# Altium footprint library ICs And Semiconductors SMD.PcbLib: 943 footprints (part 3 of 60)
Each footprint in its own frame and in the unit in brackets; x right, y up, seen from the top. Pads: shape width x height; smd on the part's side, far side on the other; paste and mask are expansions set on the pad; w line width, h text height; cw(c..) or ccw(c..) is an arc to the next point about the centre after c.
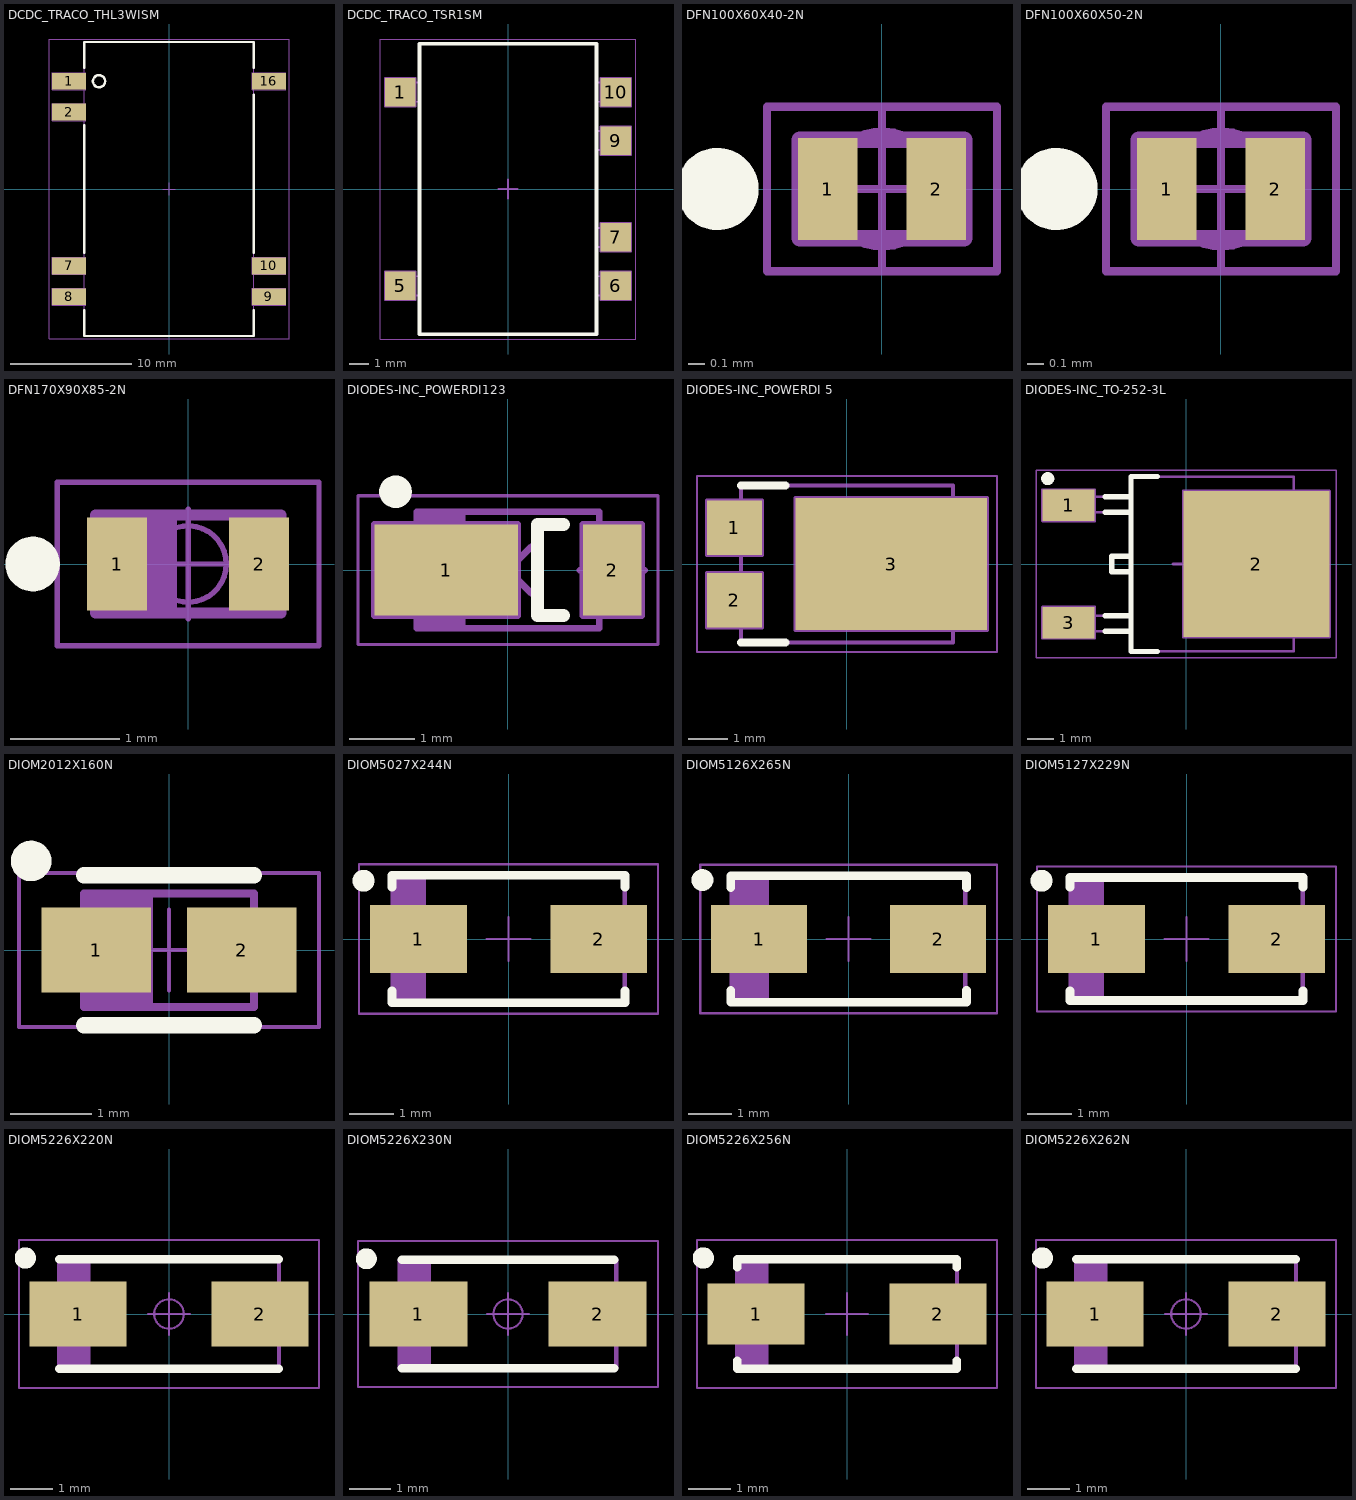
[diagram p2: the footprints below, top view; thin cyan lines are the x and y axes]

## DCDC_TRACO_THL3WISM [mm] "THL 3 WISM Series, DC/DC Converter,  Body 24x13.7mm"
height 8.5
pads (7):
  rect 2.8x1.4 smd: 1(-8.25,8.89) 2(-8.25,6.35) 7(-8.25,-6.35) 8(-8.25,-8.89) 9(8.25,-8.89) 10(8.25,-6.35) 16(8.25,8.89)
Top Overlay:
  circle w0.2: c-5.775,8.89 r0.5
  lines w0.2: -6.975,-9.99 -6.975,-12.125 6.975,-12.125 6.975,-9.99 ; -6.975,-5.25 -6.975,5.25 ; -6.975,9.99 -6.975,12.125 6.975,12.125 6.975,9.99 ; 6.975,-5.25 6.975,7.79
Mechanical 8:
  lines w0.1: -8.75,-8.89 -8.25,-8.89 ; -8.75,-6.35 -8.25,-6.35 ; -8.75,6.35 -8.25,6.35 ; -8.75,8.89 -8.25,8.89 ; -8.25,-9.39 -8.25,-8.89 ; -8.25,-8.39 -8.25,-8.89 ; -8.25,-6.85 -8.25,-6.35 ; -8.25,-5.85 -8.25,-6.35 ; -8.25,5.85 -8.25,6.35 ; -8.25,6.85 -8.25,6.35 ; -8.25,8.39 -8.25,8.89 ; -8.25,9.39 -8.25,8.89 ; -7.75,-8.89 -8.25,-8.89 ; -7.75,-6.35 -8.25,-6.35 ; -7.75,6.35 -8.25,6.35 ; -7.75,8.89 -8.25,8.89 ; -0.5,0 0,0 ; 0,-0.5 0,0 ; 0,0.5 0,0 ; 0.5,0 0,0 ; 7.75,-8.89 8.25,-8.89 ; 7.75,-6.35 8.25,-6.35 ; 7.75,8.89 8.25,8.89 ; 8.25,-9.39 8.25,-8.89 ; 8.25,-8.39 8.25,-8.89 ; 8.25,-6.85 8.25,-6.35 ; 8.25,-5.85 8.25,-6.35 ; 8.25,8.39 8.25,8.89 ; 8.25,9.39 8.25,8.89 ; 8.75,-8.89 8.25,-8.89 ; 8.75,-6.35 8.25,-6.35 ; 8.75,8.89 8.25,8.89 ; -9.65,-9.59 -6.85,-9.59 -6.85,-8.19 -9.65,-8.19 -9.65,-9.59 ; -9.65,-7.05 -6.85,-7.05 -6.85,-5.65 -9.65,-5.65 -9.65,-7.05 ; -9.65,5.65 -6.85,5.65 -6.85,7.05 -9.65,7.05 -9.65,5.65 ; -9.65,8.19 -6.85,8.19 -6.85,9.59 -9.65,9.59 -9.65,8.19 ; 6.85,-9.59 9.65,-9.59 9.65,-8.19 6.85,-8.19 6.85,-9.59 ; 6.85,-7.05 9.65,-7.05 9.65,-5.65 6.85,-5.65 6.85,-7.05 ; 6.85,8.19 9.65,8.19 9.65,9.59 6.85,9.59 6.85,8.19
Mechanical 14:
  circle w0.1: c-5.775,8.89 r0.5
  lines w0.1: -6.975,-9.39 -9.05,-9.39 -9.05,-8.39 -6.975,-8.39 ; -6.975,-6.85 -9.05,-6.85 -9.05,-5.85 -6.975,-5.85 ; -6.975,5.85 -9.05,5.85 -9.05,6.85 -6.975,6.85 ; -6.975,8.39 -9.05,8.39 -9.05,9.39 -6.975,9.39 ; 6.975,-9.39 9.05,-9.39 9.05,-8.39 6.975,-8.39 ; 6.975,-6.85 9.05,-6.85 9.05,-5.85 6.975,-5.85 ; 6.975,8.39 9.05,8.39 9.05,9.39 6.975,9.39 ; -6.975,-12.125 -6.975,12.125 6.975,12.125 6.975,-12.125 -6.975,-12.125
Mechanical 15:
  lines w0.05: -9.9,-12.375 9.9,-12.375 9.9,12.375 -9.9,12.375 -9.9,-12.375
3D body "DCDC_TRACO_THL3WISM.stp": height 8.5, standoff 0, extent -9.05,-12.125 9.05,12.125

## DCDC_TRACO_TSR1SM [mm] "TSR 1 SM Series, DC/DC Converter,  Body 15.24 x 11.8 x 7.62mm"
height 8.12
pads (6):
  rect 1.61x1.5 smd: 1(-5.655,5.08) 5(-5.655,-5.08) 6(5.655,-5.08) 7(5.655,-2.54) 9(5.655,2.54) 10(5.655,5.08)
Top Overlay:
  lines w0.2: -4.65,-7.62 -4.65,7.62 4.65,7.62 4.65,-7.62 -4.65,-7.62
Mechanical 8:
  lines w0.1: -6.155,-5.08 -5.655,-5.08 ; -6.155,5.08 -5.655,5.08 ; -5.655,-5.58 -5.655,-5.08 ; -5.655,-4.58 -5.655,-5.08 ; -5.655,4.58 -5.655,5.08 ; -5.655,5.58 -5.655,5.08 ; -5.155,-5.08 -5.655,-5.08 ; -5.155,5.08 -5.655,5.08 ; -0.5,0 0,0 ; 0,-0.5 0,0 ; 0,0.5 0,0 ; 0.5,0 0,0 ; 5.155,-5.08 5.655,-5.08 ; 5.155,-2.54 5.655,-2.54 ; 5.155,2.54 5.655,2.54 ; 5.155,5.08 5.655,5.08 ; 5.655,-5.58 5.655,-5.08 ; 5.655,-4.58 5.655,-5.08 ; 5.655,-3.04 5.655,-2.54 ; 5.655,-2.04 5.655,-2.54 ; 5.655,2.04 5.655,2.54 ; 5.655,3.04 5.655,2.54 ; 5.655,4.58 5.655,5.08 ; 5.655,5.58 5.655,5.08 ; 6.155,-5.08 5.655,-5.08 ; 6.155,-2.54 5.655,-2.54 ; 6.155,2.54 5.655,2.54 ; 6.155,5.08 5.655,5.08 ; -6.46,-5.83 -6.46,-4.33 -4.85,-4.33 -4.85,-5.83 -6.46,-5.83 ; -6.46,4.33 -6.46,5.83 -4.85,5.83 -4.85,4.33 -6.46,4.33 ; 4.85,-5.83 4.85,-4.33 6.46,-4.33 6.46,-5.83 4.85,-5.83 ; 4.85,-3.29 4.85,-1.79 6.46,-1.79 6.46,-3.29 4.85,-3.29 ; 4.85,1.79 4.85,3.29 6.46,3.29 6.46,1.79 4.85,1.79 ; 4.85,4.33 4.85,5.83 6.46,5.83 6.46,4.33 4.85,4.33
Mechanical 14:
  lines w0.1: -4.65,-5.58 -4.8,-5.58 -5.3,-5.33 -5.91,-5.33 -5.91,-4.83 -5.3,-4.83 -4.8,-4.58 -4.65,-4.58 ; -4.65,4.58 -4.8,4.58 -5.3,4.83 -5.91,4.83 -5.91,5.33 -5.3,5.33 -4.8,5.58 -4.65,5.58 ; 4.65,-5.58 4.8,-5.58 5.3,-5.33 5.91,-5.33 5.91,-4.83 5.3,-4.83 4.8,-4.58 4.65,-4.58 ; 4.65,-3.04 4.8,-3.04 5.3,-2.79 5.91,-2.79 5.91,-2.29 5.3,-2.29 4.8,-2.04 4.65,-2.04 ; 4.65,2.04 4.8,2.04 5.3,2.29 5.91,2.29 5.91,2.79 5.3,2.79 4.8,3.04 4.65,3.04 ; 4.65,4.58 4.8,4.58 5.3,4.83 5.91,4.83 5.91,5.33 5.3,5.33 4.8,5.58 4.65,5.58 ; -4.65,-7.62 -4.65,7.62 4.65,7.62 4.65,-7.62 -4.65,-7.62
Mechanical 15:
  lines w0.05: -6.71,-7.87 -6.71,7.87 6.71,7.87 6.71,-7.87 -6.71,-7.87
3D body "DCDC_TRACO_TSR1SM.stp": height 7.55, standoff 0, extent -5.91,-7.625 5.91,7.625

## DFN100X60X40-2N [mm] "DFN; 2 pin,1.00mm L X 0.60mm W X 0.40mm H, IPC Medium Density"
height 0.4
pads (2):
  rect 0.36x0.62 smd: 1(-0.33,0) 2(0.33,0)
Top Overlay:
  circle w0.25: c-1,0 r0.125
Mechanical 14:
  lines w0.1: -0.4,-0.3 -0.4,0.3 ; -0.3,-0.3 -0.3,0.3 ; -0.5,-0.3 -0.5,0.3 0.5,0.3 0.5,-0.3 -0.5,-0.3
Mechanical 15:
  circle w0.05: c0,0 r0.35
  lines w0.05: -0.5,0 0.5,0 ; 0,-0.5 0,0.5 ; -0.7,-0.5 -0.7,0.5 0.7,0.5 0.7,-0.5 -0.7,-0.5
3D body "DFN100X60X40-2N.stp": height 0.4, standoff 0, extent -0.525,-0.325 0.525,0.325

## DFN100X60X50-2N [mm] "DFN; 2 pin,1.00mm L X 0.60mm W X 0.50mm H, IPC Medium Density"
height 0.5
pads (2):
  rect 0.36x0.62 smd: 1(-0.33,0) 2(0.33,0)
Top Overlay:
  circle w0.25: c-1,0 r0.125
Mechanical 14:
  lines w0.1: -0.4,-0.3 -0.4,0.3 ; -0.3,-0.3 -0.3,0.3 ; -0.5,-0.3 -0.5,0.3 0.5,0.3 0.5,-0.3 -0.5,-0.3
Mechanical 15:
  circle w0.05: c0,0 r0.35
  lines w0.05: -0.5,0 0.5,0 ; 0,-0.5 0,0.5 ; -0.7,-0.5 -0.7,0.5 0.7,0.5 0.7,-0.5 -0.7,-0.5
3D body "DFN100X60X50-2N.stp": height 0.5, standoff 0, extent -0.525,-0.325 0.525,0.325

## DFN170X90X85-2N [mm] "DFN; 2 Pin,1.70mm L X 0.90mm W X 0.85mm H, IPC Medium Density"
height 0.85
pads (2):
  rect 0.55x0.85 smd: 1(-0.65,0) 2(0.65,0)
Top Overlay:
  circle w0.25: c-1.425,0 r0.125
Mechanical 14:
  lines w0.1: -0.75,-0.45 -0.75,0.45 ; -0.65,-0.45 -0.65,0.45 ; -0.55,-0.45 -0.55,0.45 ; -0.45,-0.45 -0.45,0.45 ; -0.35,-0.45 -0.35,0.45 ; -0.25,-0.45 -0.25,0.45 ; -0.15,-0.45 -0.15,0.45 ; -0.85,-0.45 -0.85,0.45 0.85,0.45 0.85,-0.45 -0.85,-0.45
Mechanical 15:
  circle w0.05: c0,0 r0.35
  lines w0.05: -0.5,0 0.5,0 ; 0,-0.5 0,0.5 ; -1.2,-0.75 1.2,-0.75 1.2,0.75 -1.2,0.75 -1.2,-0.75
3D body "DFN170X90X85-2N.stp": height 0.85, standoff 0, extent -0.9,-0.5 0.9,0.5

## DIODES-INC_POWERDI123 [mm] "SODFL Diode; 2.8mm W X 1.78mm L X mm H Body, POWERDI®123 Case"
height 1
pads (2):
  rect 2.2x1.4 smd: 1(-0.95,0)
  rect 0.9x1.4 smd: 2(1.6,0)
Top Overlay:
  circle w0.25: c-1.725,1.2 r0.125
  lines w0.2: 0.85,-0.7 0.45,-0.7 0.45,0.7 0.85,0.7
Mechanical 8:
  lines w0.1: -1.45,0 -0.95,0 ; -0.95,-0.5 -0.95,0 ; -0.95,0.5 -0.95,0 ; -0.45,0 -0.95,0 ; -0.354,-0.354 0,0 ; -0.354,0.354 0,0 ; 0.354,-0.354 0,0 ; 0.354,0.354 0,0 ; 1.1,0 1.6,0 ; 1.6,-0.5 1.6,0 ; 1.6,0.5 1.6,0 ; 2.1,0 1.6,0 ; -2.05,-0.7 0.15,-0.7 0.15,0.7 -2.05,0.7 -2.05,-0.7 ; 1.15,-0.7 1.15,0.7 2.05,0.7 2.05,-0.7 1.15,-0.7
Mechanical 14:
  lines w0.1: -1.3,-0.89 -1.3,0.89 ; -1.2,-0.89 -1.2,0.89 ; -1.1,-0.89 -1.1,0.89 ; -1,-0.89 -1,0.89 ; -0.9,-0.89 -0.9,0.89 ; -0.8,-0.89 -0.8,0.89 ; -0.7,-0.89 -0.7,0.89 ; 1.397,-0.887 1.4,0.89 -1.4,0.89 -1.4,-0.89 1.4,-0.89
Mechanical 15:
  lines w0.05: -2.3,-1.14 2.3,-1.14 2.3,1.14 -2.3,1.14 -2.3,-1.14
3D body "DIODES-INC_POWERDI123.stp": height 1, standoff 0, extent -1.85,-0.89 1.85,0.89

## DIODES-INC_POWERDI 5 [mm] "2.28mm pitch; 3 pin, 5.375mm L X 3.975mm W X 1.150mm H body, POWERDI 5"
height 1.15
pads (3):
  rect 1.4x1.39 smd: 1(-2.856,0.92) 2(-2.856,-0.92)
  rect 4.86x3.36 smd: 3(1.126,0)
Top Overlay:
  lines w0.2: -2.687,-1.988 -1.56,-1.988 ; -2.687,1.988 -1.56,1.988
Mechanical 8:
  lines w0.1: -3.356,-0.92 -2.856,-0.92 ; -3.356,0.92 -2.856,0.92 ; -2.856,-1.42 -2.856,-0.92 ; -2.856,-0.42 -2.856,-0.92 ; -2.856,0.42 -2.856,0.92 ; -2.856,1.42 -2.856,0.92 ; -2.356,-0.92 -2.856,-0.92 ; -2.356,0.92 -2.856,0.92 ; -0.354,-0.354 0,0 ; -0.354,0.354 0,0 ; 0.354,-0.354 0,0 ; 0.354,0.354 0,0 ; 0.626,0 1.126,0 ; 1.126,-0.5 1.126,0 ; 1.126,0.5 1.126,0 ; 1.626,0 1.126,0 ; -3.556,-1.615 -2.156,-1.615 -2.156,-0.225 -3.556,-0.225 -3.556,-1.615 ; -3.556,0.225 -2.156,0.225 -2.156,1.615 -3.556,1.615 -3.556,0.225 ; -1.304,-1.68 3.556,-1.68 3.556,1.68 -1.304,1.68 -1.304,-1.68
Mechanical 14:
  lines w0.1: -2.687,-1.365 -3.25,-1.365 -3.25,-0.475 -2.687,-0.475 ; -2.687,-0.445 -2.687,0.445 ; -2.687,0.475 -3.25,0.475 -3.25,1.365 -2.687,1.365 ; 2.688,-0.895 3.25,-0.895 3.25,-0.595 3.15,-0.595 3.15,0.595 3.25,0.595 3.25,0.895 2.688,0.895 ; -2.687,-1.988 2.688,-1.988 2.688,1.988 -2.687,1.988 -2.687,-1.988
Mechanical 15:
  lines w0.05: -3.806,-2.238 -3.806,2.238 3.806,2.238 3.806,-2.238 -3.806,-2.238
3D body "DIODES-INC_POWERDI 5.stp": height 1.15, standoff 0, extent -3.25,-1.987 3.25,1.988

## DIODES-INC_TO-252-3L [mm] "DPAK TO-252, 2.28mm pitch; 2 pin, 9.7mm L X 6.7mm W X 2.40mm H body"
height 2.4
pads (3):
  rect 2x1.2 smd: 1(-4.5,2.25) 3(-4.5,-2.25)
  rect 5.6x5.6 smd: 2(2.7,0)
Top Overlay:
  circle w0.25: c-5.3,3.27 r0.125
  lines w0.2: -3.1,-2.58 -2.104,-2.58 ; -3.1,-1.98 -2.104,-1.98 ; -3.1,1.98 -2.104,1.98 ; -3.1,2.58 -2.104,2.58 ; -2.104,-0.3 -2.844,-0.3 -2.844,0.3 -2.104,0.3 ; -1.104,-3.35 -2.104,-3.35 -2.104,3.35 -1.104,3.35
Top Paste:
  region: 0.47,-2.05 2.35,-2.05 2.35,-0.35 0.47,-0.35
  region: 3.05,-2.05 4.93,-2.05 4.93,-0.35 3.05,-0.35
  region: 0.47,0.35 2.35,0.35 2.35,2.05 0.47,2.05
  region: 3.05,0.35 4.93,0.35 4.93,2.05 3.05,2.05
Mechanical 8:
  lines w0.1: -5,-2.25 -4.5,-2.25 ; -5,2.25 -4.5,2.25 ; -4.5,-2.75 -4.5,-2.25 ; -4.5,-1.75 -4.5,-2.25 ; -4.5,1.75 -4.5,2.25 ; -4.5,2.75 -4.5,2.25 ; -4,-2.25 -4.5,-2.25 ; -4,2.25 -4.5,2.25 ; -0.5,0 0,0 ; 0,-0.5 0,0 ; 0,0.5 0,0 ; 0.5,0 0,0 ; 2.2,0 2.7,0 ; 2.7,-0.5 2.7,0 ; 2.7,0.5 2.7,0 ; 3.2,0 2.7,0 ; -5.5,-2.85 -5.5,-1.65 -3.5,-1.65 -3.5,-2.85 -5.5,-2.85 ; -5.5,1.65 -5.5,2.85 -3.5,2.85 -3.5,1.65 -5.5,1.65 ; -0.1,-2.8 -0.1,2.8 5.5,2.8 5.5,-2.8 -0.1,-2.8
Mechanical 14:
  lines w0.1: -2.104,-2.58 -5.2,-2.58 -5.2,-1.98 -2.104,-1.98 ; -2.104,-0.3 -2.844,-0.3 -2.844,0.3 -2.104,0.3 ; -2.104,1.98 -5.2,1.98 -5.2,2.58 -2.104,2.58 ; 4.125,-2.7 4.8,-2.7 ccw(c4.8,-2.3) 5.2,-2.3 5.2,2.3 ccw(c4.8,2.3) 4.8,2.7 4.125,2.7 ; -2.104,-3.35 4.125,-3.35 4.125,3.35 -2.104,3.35 -2.104,-3.35
Mechanical 15:
  lines w0.05: -5.75,-3.6 -5.75,3.6 5.75,3.6 5.75,-3.6 -5.75,-3.6
3D body "DIODES-INC_TO-252-3L.stp": height 2.4, standoff 0, extent -5.2,-3.35 5.2,3.35

## DIOM2012X160N [mm] "SOD110 Diode, Molded Body; 2.00mm L X 1.25mm W, IPC Medium Density"
height 1.6
pads (2):
  rect 1.35x1.05 smd: 1(-0.9,0) 2(0.9,0)
Top Overlay:
  circle w0.25: c-1.7,1.1 r0.125
  lines w0.2: -1.05,-0.925 1.05,-0.925 ; -1.05,0.925 1.05,0.925
Mechanical 14:
  lines w0.1: -0.95,-0.7 -0.95,0.7 ; -0.85,-0.7 -0.85,0.7 ; -0.75,-0.7 -0.75,0.7 ; -0.65,-0.7 -0.65,0.7 ; -0.55,-0.7 -0.55,0.7 ; -0.45,-0.7 -0.45,0.7 ; -0.35,-0.7 -0.35,0.7 ; -0.25,-0.7 -0.25,0.7 ; -1.05,-0.7 1.05,-0.7 1.05,0.7 -1.05,0.7 -1.05,-0.7
Mechanical 15:
  lines w0.05: -0.5,0 0.5,0 ; 0,-0.5 0,0.5 ; -1.85,-0.95 1.85,-0.95 1.85,0.95 -1.85,0.95 -1.85,-0.95
3D body "DIOM2012X160N.stp": height 1.6, standoff 0, extent -1.05,-0.7 1.05,0.7

## DIOM5027X244N [mm] "DO-214-AC/SMA  Molded Diode, Body 5.0x2.7mm, IPC Medium Density"
height 2.44
pads (2):
  rect 2.2x1.55 smd: 1(-2.05,0) 2(2.05,0)
Top Overlay:
  circle w0.25: c-3.3,1.325 r0.125
  lines w0.2: -2.65,-1.175 -2.65,-1.45 2.65,-1.45 2.65,-1.175 ; -2.65,1.175 -2.65,1.45 2.65,1.45 2.65,1.175
Mechanical 14:
  lines w0.1: -2.575,-1.45 -2.575,1.45 ; -2.525,-1.45 -2.525,1.45 ; -2.45,-1.45 -2.45,1.45 ; -2.375,-1.45 -2.375,1.45 ; -2.3,-1.45 -2.3,1.45 ; -2.225,-1.45 -2.225,1.45 ; -2.15,-1.45 -2.15,1.45 ; -2.075,-1.45 -2.075,1.45 ; -2,-1.45 -2,1.45 ; -1.925,-1.45 -1.925,1.45 ; -2.64,-1.45 -2.64,1.45 2.64,1.45 2.64,-1.45 -2.64,-1.45
Mechanical 15:
  lines w0.05: -0.5,0 0.5,0 ; 0,-0.5 0,0.5 ; -3.4,-1.7 -3.4,1.7 3.4,1.7 3.4,-1.7 -3.4,-1.7
3D body "DIOM5027X244N.stp": height 2.44, standoff 0, extent -2.6,-1.45 2.6,1.45

## DIOM5126X265N [mm] "DO-214-AC/SMA Molded Diode, 2-Leads, Body 5.1x2.6mm, IPC Medium Density"
height 2.65
pads (2):
  rect 2.2x1.55 smd: 1(-2.05,0) 2(2.05,0)
Top Overlay:
  circle w0.25: c-3.35,1.35 r0.125
  lines w0.2: -2.7,-1.175 -2.7,-1.45 2.7,-1.45 2.7,-1.175 ; -2.7,1.175 -2.7,1.45 2.7,1.45 2.7,1.175
Mechanical 13:
  lines w0.001: -2.675,-1.45 -2.675,1.45 2.675,1.45 2.675,-1.45 -2.675,-1.45
Mechanical 14:
  lines w0.1: -2.575,-1.45 -2.575,1.45 ; -2.475,-1.45 -2.475,1.45 ; -2.375,-1.45 -2.375,1.45 ; -2.275,-1.45 -2.275,1.45 ; -2.175,-1.45 -2.175,1.45 ; -2.075,-1.45 -2.075,1.45 ; -1.975,-1.45 -1.975,1.45 ; -1.875,-1.45 -1.875,1.45 ; -2.675,-1.45 -2.675,1.45 2.675,1.45 2.675,-1.45 -2.675,-1.45
Mechanical 15:
  lines w0.05: -0.5,0 0.5,0 ; 0,-0.5 0,0.5 ; -3.4,-1.7 -3.4,1.7 3.4,1.7 3.4,-1.7 -3.4,-1.7
3D body "DIOM5126X265N.stp": height 2.65, standoff 0, extent -2.675,-1.45 2.675,1.45

## DIOM5127X229N [mm] "DO-214-AC/SMA Molded Diode, 2-Leads, Body 5.1x2.7mm, IPC Medium Density"
height 2.29
pads (2):
  rect 2.2x1.55 smd: 1(-2.05,0) 2(2.05,0)
Top Overlay:
  circle w0.25: c-3.3,1.325 r0.125
  lines w0.2: -2.65,-1.175 -2.65,-1.4 2.65,-1.4 2.65,-1.175 ; -2.65,1.175 -2.65,1.4 2.65,1.4 2.65,1.175
Mechanical 14:
  lines w0.1: -2.6,-1.395 -2.6,1.395 ; -2.525,-1.395 -2.525,1.395 ; -2.475,-1.395 -2.475,1.395 ; -2.4,-1.395 -2.4,1.395 ; -2.325,-1.395 -2.325,1.395 ; -2.25,-1.395 -2.25,1.395 ; -2.175,-1.395 -2.175,1.395 ; -2.1,-1.395 -2.1,1.395 ; -2.025,-1.395 -2.025,1.395 ; -1.93,-1.395 -1.93,1.395 ; -2.64,-1.395 2.64,-1.395 2.64,1.395 -2.64,1.395 -2.64,-1.395
Mechanical 15:
  lines w0.05: -0.5,0 0.5,0 ; 0,-0.5 0,0.5 ; -3.4,-1.65 3.4,-1.65 3.4,1.65 -3.4,1.65 -3.4,-1.65
3D body "DIOM5127X229N.stp": height 2.29, standoff 0, extent -2.675,-1.45 2.675,1.45

## DIOM5226X220N [mm] "DO-214-AC/SMA Diode, Molded Body; 5.21mm L X 2.60mm W X 2.20mm H, IPC Medium Density"
height 2.2
pads (2):
  rect 2.3x1.55 smd: 1(-2.15,0) 2(2.15,0)
Top Overlay:
  circle w0.25: c-3.4,1.325 r0.125
  lines w0.2: -2.6,-1.3 2.6,-1.3 ; -2.6,1.3 2.6,1.3
Mechanical 14:
  lines w0.1: -2.505,-1.302 -2.505,1.302 ; -2.405,-1.302 -2.405,1.302 ; -2.305,-1.302 -2.305,1.302 ; -2.205,-1.302 -2.205,1.302 ; -2.105,-1.302 -2.105,1.302 ; -2.005,-1.302 -2.005,1.302 ; -1.905,-1.302 -1.905,1.302 ; -2.605,-1.302 -2.605,1.302 ; -2.605,-1.302 -2.605,1.302 ; -2.605,-1.302 2.605,-1.302 2.605,1.302 -2.605,1.302
Mechanical 15:
  circle w0.05: c0,0 r0.35
  lines w0.05: -0.5,0 0.5,0 ; 0,-0.5 0,0.5 ; -3.55,-1.75 -3.55,1.75 3.55,1.75 3.55,-1.75 -3.55,-1.75
3D body "DIOM5226X220N.stp": height 2.2, standoff 0, extent -2.6,-1.3 2.6,1.3

## DIOM5226X230N [mm] "DO-214-AC/SMA Diode, Molded Body; 5.195mm L X 2.605mm W X 2.30mm H, IPC Medium Density"
height 2.3
pads (2):
  rect 2.35x1.55 smd: 1(-2.15,0) 2(2.15,0)
Top Overlay:
  circle w0.25: c-3.4,1.325 r0.125
  lines w0.2: -2.55,-1.3 2.55,-1.3 ; -2.55,1.3 2.55,1.3
Mechanical 14:
  lines w0.1: -2.498,-1.302 -2.498,1.302 ; -2.398,-1.302 -2.398,1.302 ; -2.298,-1.302 -2.298,1.302 ; -2.198,-1.302 -2.198,1.302 ; -2.098,-1.302 -2.098,1.302 ; -1.998,-1.302 -1.998,1.302 ; -1.898,-1.302 -1.898,1.302 ; -2.598,-1.302 -2.598,1.302 ; -2.598,-1.302 -2.598,1.302 ; -2.598,-1.302 2.598,-1.302 2.598,1.302 -2.598,1.302
Mechanical 15:
  circle w0.05: c0,0 r0.35
  lines w0.05: -0.5,0 0.5,0 ; 0,-0.5 0,0.5 ; -3.6,-1.75 3.6,-1.75 3.6,1.75 -3.6,1.75 -3.6,-1.75
3D body "DIOM5226X230N.stp": height 2.3, standoff 0, extent -2.75,-1.4 2.45,1.2

## DIOM5226X256N [mm] "DO-214-AC/SMA Molded Diode, Body 5.2x2.6mm, IPC Medium Density"
height 2.56
pads (2):
  rect 2.3x1.45 smd: 1(-2.15,0) 2(2.15,0)
Top Overlay:
  circle w0.25: c-3.4,1.325 r0.125
  lines w0.2: -2.6,-1.1 -2.6,-1.3 2.6,-1.3 2.6,-1.1 ; -2.6,1.1 -2.6,1.3 2.6,1.3 2.6,1.1
Mechanical 14:
  lines w0.1: -2.505,-1.302 -2.505,1.302 ; -2.405,-1.302 -2.405,1.302 ; -2.305,-1.302 -2.305,1.302 ; -2.205,-1.302 -2.205,1.302 ; -2.105,-1.302 -2.105,1.302 ; -2.005,-1.302 -2.005,1.302 ; -1.905,-1.302 -1.905,1.302 ; -2.605,-1.302 2.605,-1.302 2.605,1.302 -2.605,1.302 -2.605,-1.302
Mechanical 15:
  lines w0.05: -0.5,0 0.5,0 ; 0,-0.5 0,0.5 ; -3.55,-1.75 3.55,-1.75 3.55,1.75 -3.55,1.75 -3.55,-1.75
3D body "DIOM5226X256N.stp": height 2.56, standoff 0, extent -2.6,-1.3 2.6,1.3

## DIOM5226X262N [mm] "DO-214-AC/SMA Diode, Molded Body; 5.21mm L X 2.605mm W X 2.62mm H, IPC Medium Density"
height 2.62
pads (2):
  rect 2.3x1.55 smd: 1(-2.15,0) 2(2.15,0)
Top Overlay:
  circle w0.25: c-3.4,1.325 r0.125
  lines w0.2: -2.6,-1.3 2.6,-1.3 ; -2.6,1.3 2.6,1.3
Mechanical 14:
  lines w0.1: -2.505,-1.302 -2.505,1.302 ; -2.405,-1.302 -2.405,1.302 ; -2.305,-1.302 -2.305,1.302 ; -2.205,-1.302 -2.205,1.302 ; -2.105,-1.302 -2.105,1.302 ; -2.005,-1.302 -2.005,1.302 ; -1.905,-1.302 -1.905,1.302 ; -2.605,-1.302 2.605,-1.302 2.605,1.302 -2.605,1.302 ; -2.605,-1.302 -2.605,1.302 ; -2.605,-1.302 -2.605,1.302
Mechanical 15:
  circle w0.05: c0,0 r0.35
  lines w0.05: -0.5,0 0.5,0 ; 0,-0.5 0,0.5 ; -3.55,-1.75 3.55,-1.75 3.55,1.75 -3.55,1.75 -3.55,-1.75
3D body "DIOM5226X262N.stp": height 2.62, standoff 0, extent -2.6,-1.3 2.6,1.305